# Altium footprint library MEGAphone.PcbLib: 64 footprints (part 1 of 4)
Each footprint in its own frame and in the unit in brackets; x right, y up, seen from the top. Pads: shape width x height; smd on the part's side, far side on the other; paste and mask are expansions set on the pad; w line width, h text height; cw(c..) or ccw(c..) is an arc to the next point about the centre after c.
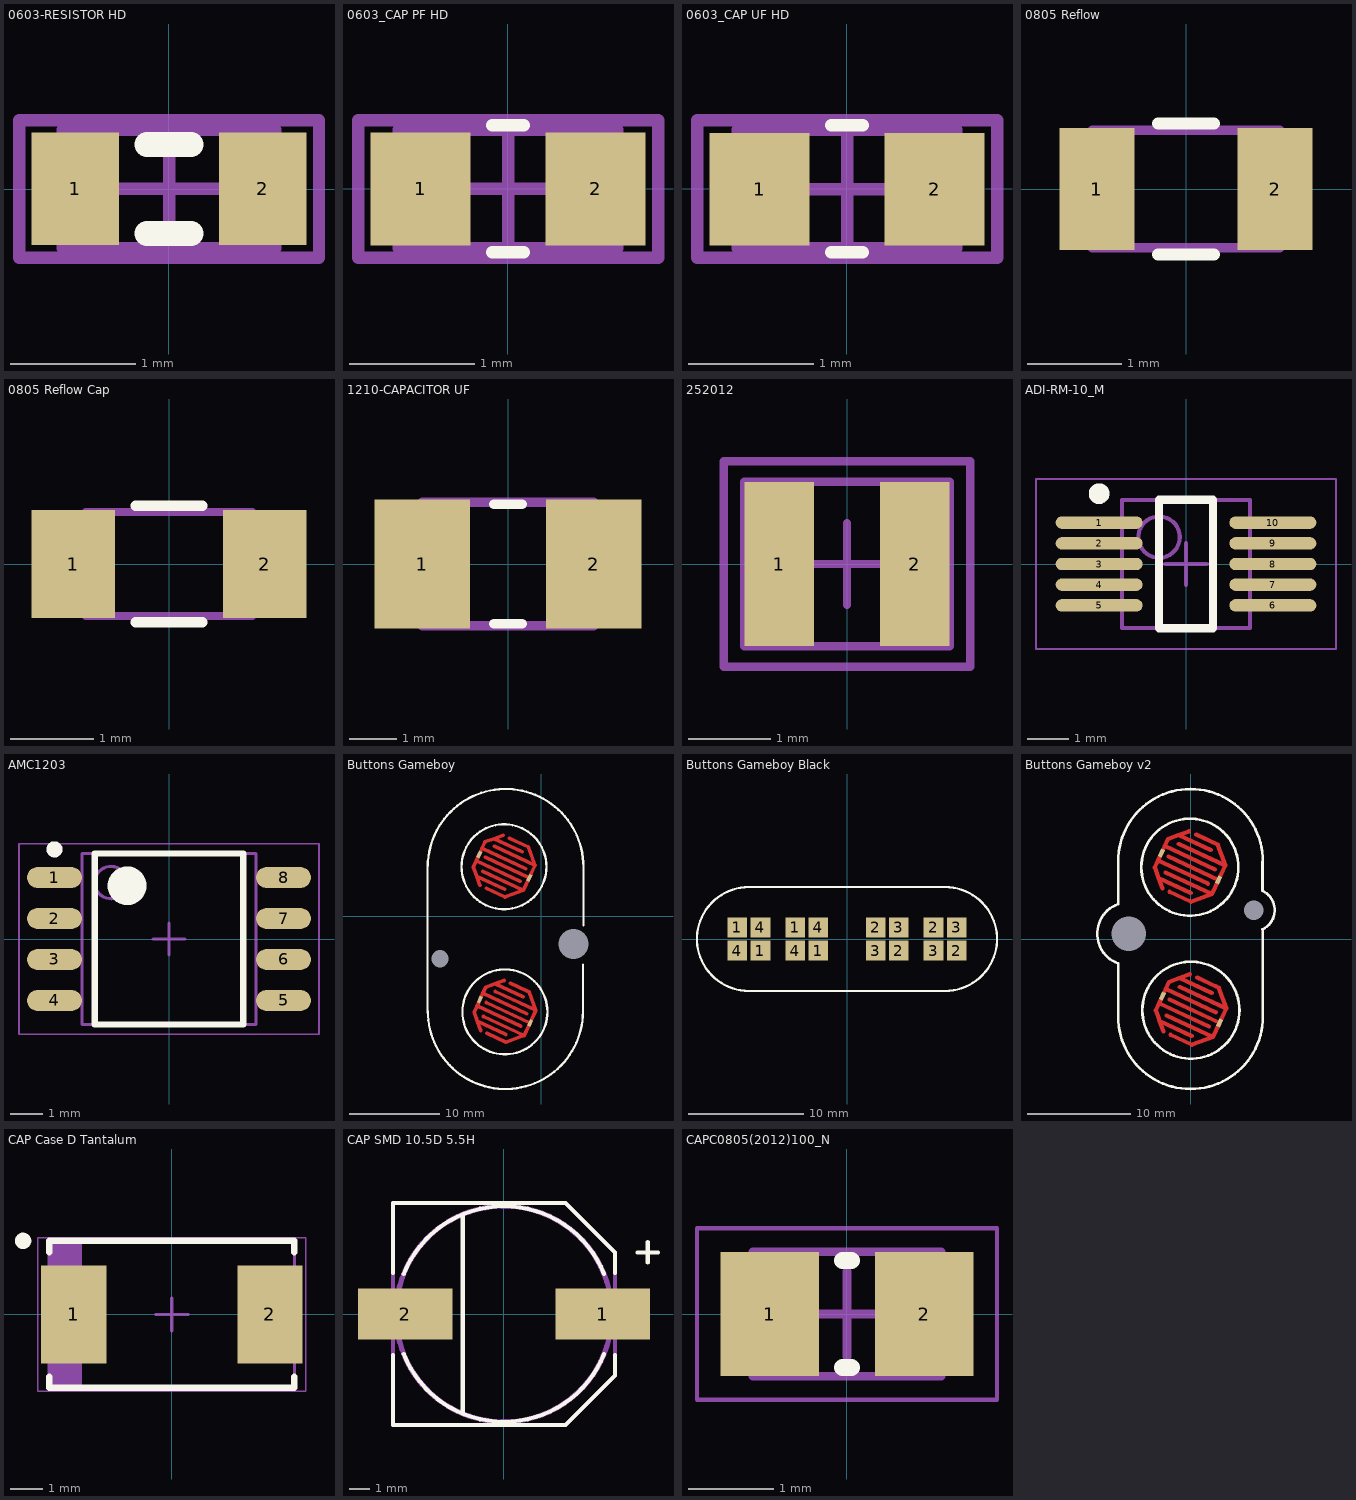
[diagram p0: the footprints below, top view; thin cyan lines are the x and y axes]

## 8SOP [mm] "Footprint for AMC1203PSA"
height 2

## 0603-RESISTOR HD [mm] "Chip Resistor, Body 1.6x0.8mm, IPC High Density"
height 0.6
pads (2):
  rect 0.7x0.9 smd: 1(-0.75,0) 2(0.75,0)
Top Overlay:
  lines w0.2: -0.178,-0.356 0.178,-0.356 ; -0.178,0.356 0.178,0.356
Mechanical 13:
  lines w0.1: -0.85,-0.475 -0.85,0.475 0.85,0.475 0.85,-0.475 -0.85,-0.475
Mechanical 15:
  lines w0.1: -0.475,0 0.475,0 ; 0,-0.475 0,0.475 ; -1.2,-0.55 -1.2,0.55 1.2,0.55 1.2,-0.55 -1.2,-0.55
3D body: height 0.6, standoff 0, extent -0.85,-0.475 0.85,0.475

## 0603_CAP PF HD [mm] "Chip Capacitor, Body 1.6x0.8mm, IPC High Density"
height 0.35
pads (2):
  rect 0.8x0.9 smd: 1(-0.7,0) 2(0.7,0)
Top Overlay:
  lines w0.1: -0.127,-0.508 0.127,-0.508 ; -0.127,0.508 0.127,0.508
Mechanical 13:
  lines w0.1: -0.875,-0.475 0.875,-0.475 0.875,0.475 -0.875,0.475 -0.875,-0.475
Mechanical 15:
  lines w0.1: -0.475,0 0.475,0 ; 0,-0.475 0,0.475 ; -1.2,-0.55 1.2,-0.55 1.2,0.55 -1.2,0.55 -1.2,-0.55
3D body: height 0.35, standoff 0, extent -0.875,-0.475 0.875,0.475

## 0603_CAP UF HD [mm] "Chip Capacitor, Body 1.6x0.8mm, IPC High Density"
height 0.8
pads (2):
  rect 0.8x0.9 smd: 1(-0.7,0) 2(0.7,0)
Top Overlay:
  lines w0.1: -0.127,-0.508 0.127,-0.508 ; -0.127,0.508 0.127,0.508
Mechanical 13:
  lines w0.1: -0.875,-0.475 -0.875,0.475 0.875,0.475 0.875,-0.475 -0.875,-0.475
Mechanical 15:
  lines w0.1: -0.475,0 0.475,0 ; 0,-0.475 0,0.475 ; -1.2,-0.55 -1.2,0.55 1.2,0.55 1.2,-0.55 -1.2,-0.55
3D body: height 0.8, standoff 0, extent -0.875,-0.475 0.875,0.475

## 0805 Reflow [mm]
pads (2):
  rect 0.8x1.3 smd: 1(-0.95,0) 2(0.95,0)
Top Overlay:
  lines w0.127: -0.3,-0.7 0.3,-0.7 ; -0.3,0.7 0.3,0.7
Mechanical 13:
  lines w0.1: -1,-0.625 1,-0.625 1,0.625 -1,0.625 -1,-0.625
3D body: height 0.5, standoff 0, extent -1,-0.625 1,0.625

## 0805 Reflow Cap [mm]
pads (2):
  rect 1x1.3 smd: 1(-1.15,0) 2(1.15,0)
Top Overlay:
  lines w0.127: -0.4,-0.7 0.4,-0.7 ; -0.4,0.7 0.4,0.7
Mechanical 13:
  lines w0.1: -1,-0.625 1,-0.625 1,0.625 -1,0.625 -1,-0.625
3D body: height 1, standoff 0, extent -1,-0.625 1,0.625

## 1210-CAPACITOR UF [mm] "Body 3.2 x 2.5 mm (LxW typ)"
height 2.5
pads (2):
  rect 2x2.7 smd: 1(-1.8,0) 2(1.8,0)
Top Overlay:
  lines w0.2: -0.3,-1.25 0.3,-1.25 ; -0.3,1.25 0.3,1.25
Mechanical 13:
  lines w0.2: -1.8,-1.3 0,-1.3 1.8,-1.3 1.8,0 1.8,1.3 0,1.3 -1.8,1.3 -1.8,0 -1.8,-1.3
3D body: height 2.5, standoff 0, extent -1.799,-1.299 1.799,1.299

## 252012 [mm] "SMD Power Inductor, 2-Leads, Body 2.5x2.0mm"
height 1.2
pads (2):
  rect 0.85x2 smd: 1(-0.825,0) 2(0.825,0)
Mechanical 13:
  lines w0.1: -1.25,-1 1.25,-1 1.25,1 -1.25,1 -1.25,-1
Mechanical 15:
  lines w0.1: -0.5,0 0.5,0 ; 0,-0.5 0,0.5 ; -1.5,-1.25 1.5,-1.25 1.5,1.25 -1.5,1.25 -1.5,-1.25
3D body "LQS_252012.stp": height 1.18, standoff -0.02, extent -1.25,-1 1.25,1

## ADI-RM-10_M [mm] "SOP, 10-Leads, Body 3x3mm, Pitch 0.5mm, IPC Low Density"
height 1.1
pads (10):
  oval 2.1x0.3 smd: 1(-2.1,1) 2(-2.1,0.5) 3(-2.1,0) 4(-2.1,-0.5) 5(-2.1,-1) 6(2.1,-1) 7(2.1,-0.5) 8(2.1,0) 9(2.1,0.5) 10(2.1,1)
Top Overlay:
  circle w0.25: c-2.1,1.7 r0.125
  lines w0.2: -0.65,-1.55 -0.65,1.55 0.65,1.55 0.65,-1.55 -0.65,-1.55
Mechanical 13:
  circle w0.1: c-0.65,0.65 r0.5
  lines w0.1: -1.55,-1.55 -1.55,1.55 1.55,1.55 1.55,-1.55 -1.55,-1.55
Mechanical 15:
  lines w0.05: -3.625,-2.05 -3.625,2.05 3.625,2.05 3.625,-2.05 -3.625,-2.05
  lines w0.1: -0.5,0 0.5,0 ; 0,-0.5 0,0.5
3D body: height 1.1, standoff 0.05, extent -1.55,-1.55 1.55,1.55

## AMC1203 [mm] "SOP, 8-Leads, Body 5.27x5.30mm, Pitch 1.27mm, IPC Medium Density"
height 2
pads (8):
  oval 1.7x0.65 smd: 1(-3.55,1.905) 2(-3.55,0.635) 3(-3.55,-0.635) 4(-3.55,-1.905) 5(3.55,-1.905) 6(3.55,-0.635) 7(3.55,0.635) 8(3.55,1.905)
Top Overlay:
  circle w0.25: c-3.55,2.78 r0.125
  circle w0.6: c-1.3,1.65 r0.3
  lines w0.2: -2.3,-2.65 -2.3,2.65 2.3,2.65 2.3,-2.65 -2.3,-2.65
Mechanical 13:
  circle w0.1: c-1.8,1.75 r0.5
  lines w0.1: -2.7,-2.65 -2.7,2.65 2.7,2.65 2.7,-2.65 -2.7,-2.65
Mechanical 15:
  lines w0.05: -4.65,-2.95 -4.65,2.95 4.65,2.95 4.65,-2.95 -4.65,-2.95
  lines w0.1: -0.5,0 0.5,0 ; 0,-0.5 0,0.5
3D body "AMC1203.step": height 2, standoff 0, extent -3.95,-2.65 3.95,2.65

## Buttons Gameboy [mil]
pads (6):
  rect 32x16 smd rot 65 paste-118.11: 1(-270.57,268.2) 2(-266.76,-362.51) 3(-49.25,-463.94) 4(-53.06,166.77)
  round 0 hole 129.92: 27(140,-120)
  round 0 hole 74.8: ""(-440,-185)
Top Layer:
  lines w16: -266.91,134.08 -281.42,173.95 ; -263.1,-496.62 -277.61,-456.75 ; -255.15,194.8 -78.42,112.39 ; -251.34,-435.9 -74.61,-518.31 ; -243.39,255.52 -53.06,166.77 ; -239.72,121.4 -158.15,83.37 -150.8,86.04 -78.42,112.39 ; -239.57,-375.18 -49.25,-463.94 ; -235.91,-509.3 -154.34,-547.33 -74.61,-518.31 ; -204.43,303.56 -27.7,221.15 ; -200.62,-327.15 -23.89,-409.56 ; -165.48,351.6 -205.35,337.09 ; -161.67,-279.11 -201.54,-293.62 ; -159.07,116.9 -281.42,173.95 ; -155.26,-513.81 -277.61,-456.75 ; -138.29,338.92 -56.72,300.88 -27.7,221.15 ; -134.48,-291.78 -64.13,-324.59 -52.91,-329.82 -23.89,-409.56 ; -92.93,152.26 -283.25,241.01 ; -89.12,-478.44 -279.44,-389.7 ; -83,280.03 -205.35,337.09 ; -79.19,-350.67 -201.54,-293.62 ; -67.57,206.64 -257.9,295.39 ; -63.76,-424.07 -254.09,-335.32 ; -283.25,241.01 -270.57,268.2 ; -283.25,241.01 -295.93,213.82 -281.42,173.95 ; -279.44,-389.7 -266.76,-362.51 -254.09,-335.32 ; -279.44,-389.7 -292.12,-416.88 -282.19,-444.17 -277.61,-456.75 ; -270.57,268.2 -257.9,295.39 ; -270.57,268.2 -270.57,268.2 ; -270.57,268.2 -270.57,268.2 ; -257.9,295.39 -245.22,322.57 -205.35,337.09 ; -254.09,-335.32 -241.41,-308.13 -201.54,-293.62 ; -78.42,112.39 -53.06,166.77 ; -74.61,-518.31 -49.25,-463.94 ; -74.61,-518.31 -49.25,-463.94 ; -53.06,166.77 -27.7,221.15 ; -49.25,-463.94 -23.89,-409.56
Top Overlay:
  circle w10: c-162.4,214.87 r184.69
  circle w10: c-158.46,-415.89 r184.69
  lines w10: -495,-412.41 -495,240 ; -493.66,219.76 cw(c-155.48,214.53) 182.73,214.57 182.73,-40.35 ; -493.12,-412.41 ccw(c-156.2,-414.06) 180.72,-414.06 ; 180.72,-424.07 180.72,-211.61
Top Solder:
  circle w177.17: c-162.4,214.87 r78.74
  circle w177.17: c-158.46,-415.89 r78.74

## Buttons Gameboy Black [mm] "DMG-SEL"
pads (16):
  rect 1.7x1.7 smd paste-3: 1(-9.5,1) 1(-7.5,-1) 1(-4.5,1) 1(-2.5,-1) 2(2.5,1) 2(4.5,-1) 2(7.5,1) 2(9.5,-1) 3(2.5,-1) 3(4.5,1) 3(7.5,-1) 3(9.5,1) 4(-9.5,-1) 4(-7.5,1) 4(-4.5,-1) 4(-2.5,1)
Top Overlay:
  lines w0.2: -8.5,-4.5 cw(c-8.5,0) -8.5,4.5 8.5,4.5 cw(c8.5,0) 8.5,-4.5 -8.5,-4.5
Top Solder:
  region: -1.5,2 -5.5,2 -5.5,-2 -1.5,-2
  rectangle: -10.5,-2 -6.5,2
  region: 10.5,2 6.5,2 6.5,-2 10.5,-2
  rectangle: 1.5,-2 5.5,2

## Buttons Gameboy v2 [mil]
pads (6):
  rect 32x16 smd rot 65 paste-118.11: 1(-110.57,326.56) 2(-106.76,-217.51) 3(110.75,-318.94) 4(106.94,225.13)
  round 0 hole 129.92: 27(-235,20)
  round 0 hole 74.8: ""(240,110)
Top Layer:
  lines w16: -106.91,192.45 -121.42,232.32 ; -103.1,-351.62 -117.61,-311.75 ; -95.15,253.17 81.58,170.75 ; -91.34,-290.9 85.39,-373.31 ; -83.39,313.88 106.94,225.13 ; -79.72,179.77 1.85,141.73 9.2,144.41 81.58,170.75 ; -79.57,-230.18 110.75,-318.94 ; -75.91,-364.3 5.66,-402.33 85.39,-373.31 ; -44.43,361.92 132.3,279.51 ; -40.62,-182.15 136.11,-264.56 ; -5.48,409.96 -45.35,395.45 ; -1.67,-134.11 -41.54,-148.62 ; 0.93,175.26 -121.42,232.32 ; 4.74,-368.81 -117.61,-311.75 ; 21.71,397.28 103.28,359.25 132.3,279.51 ; 25.52,-146.78 95.87,-179.59 107.09,-184.82 136.11,-264.56 ; 67.07,210.62 -123.25,299.37 ; 70.88,-333.44 -119.44,-244.7 ; 77,338.4 -45.35,395.45 ; 80.81,-205.67 -41.54,-148.62 ; 92.43,265 -97.9,353.75 ; 96.24,-279.07 -94.08,-190.32 ; -123.25,299.37 -110.57,326.56 ; -123.25,299.37 -135.93,272.18 -121.42,232.32 ; -119.44,-244.7 -106.76,-217.51 -94.08,-190.32 ; -119.44,-244.7 -132.12,-271.88 -122.19,-299.17 -117.61,-311.75 ; -110.57,326.56 -97.9,353.75 ; -110.57,326.56 -110.57,326.56 ; -110.57,326.56 -110.57,326.56 ; -97.9,353.75 -85.22,380.94 -45.35,395.45 ; -94.08,-190.32 -81.41,-163.13 -41.54,-148.62 ; 81.58,170.75 106.94,225.13 ; 85.39,-373.31 110.75,-318.94 ; 85.39,-373.31 110.75,-318.94 ; 106.94,225.13 132.3,279.51 ; 110.75,-318.94 136.11,-264.56
Top Overlay:
  circle w10: c-2.4,273.23 r184.69
  circle w10: c1.54,-270.89 r184.69
  lines w10: -275.59,-295.28 ccw(c0,-295.28) 275.59,-295.28 275.59,35.44 ; -275.59,-293.92 -275.59,-94.5 ; -275.59,295.28 cw(c0,295.28) 275.59,295.28 ; -275,135 -275,300 ; -274.42,-93.34 cw(c-235,20) -274.42,133.34 ; 274.09,36.94 ccw(c240,110) 274.09,183.06 274.09,293.81
Top Solder:
  circle w177.17: c-2.4,273.23 r78.74
  circle w177.17: c1.54,-270.89 r78.74

## CAP Case D Tantalum [mm] "Molded Capacitor, 2-Leads, Body 7.50x4.5mm"
height 3.1
pads (2):
  rect 2x3 smd: 1(-3,0) 2(3,0)
Top Overlay:
  circle w0.25: c-4.55,2.25 r0.125
  lines w0.2: -3.75,-1.9 -3.75,-2.25 3.75,-2.25 3.75,-1.9 ; -3.75,1.9 -3.75,2.25 3.75,2.25 3.75,1.9
Mechanical 13:
  region: -2.741,2.25 -3.75,2.25 -3.75,-2.25 -2.741,-2.25
  lines w0.1: -3.75,-2.25 -3.75,2.25 3.75,2.25 3.75,-2.25 -3.75,-2.25
Mechanical 15:
  lines w0.05: -4.1,-2.35 -4.1,2.35 4.1,2.35 4.1,-2.35 -4.1,-2.35
  lines w0.1: -0.5,0 0.5,0 ; 0,-0.5 0,0.5
3D body "CAPMP7344X31L.step": height 3.1, standoff 0, extent -3.97,-2.25 3.97,2.25

## CAP SMD 10.5D 5.5H [mm]
height 5.5
pads (2):
  rect 4.6x2.5 smd: 1(4.8,0) 2(-4.8,0)
Top Overlay:
  lines w0.2: -5.4,-2 -5.4,-5.4 3,-5.4 5.4,-3 5.4,-2 ; -5.4,2 -5.4,5.4 3,5.4 5.4,3 5.4,2 ; -4.875,-1.95 ccw(c0,0) 4.875,-1.95 ; -4.875,1.95 cw(c0,0) 4.875,1.95 ; -2,-4.8 -2,0 -2,4.8 ; 6.5,3 7.5,3 ; 7,2.5 7,3.5
Mechanical 13:
  circle w0.254: c0,0 r5.25
  lines w0.2: -5.4,-5.4 -5.4,0 -5.4,5.4 3,5.4 5.4,3 5.4,0 5.4,-3 3,-5.4 -5.4,-5.4
3D body: height 5.5, standoff 0, extent -5.249,-5.249 5.249,5.249
3D body: height 1, standoff 0, extent -5.401,-5.401 5.401,5.401

## CAPC0805(2012)100_N [mm] "Chip Capacitor, Body 2.0x1.2mm, Height 1.0mm, IPC Medium Density"
height 1
pads (2):
  rect 1.15x1.45 smd: 1(-0.9,0) 2(0.9,0)
Top Overlay:
  lines w0.2: -0.05,-0.625 0.05,-0.625 ; -0.05,0.625 0.05,0.625
Mechanical 13:
  lines w0.1: -1.1,-0.725 1.1,-0.725 1.1,0.725 -1.1,0.725 -1.1,-0.725
Mechanical 15:
  lines w0.05: -1.75,-1 1.75,-1 1.75,1 -1.75,1 -1.75,-1
  lines w0.1: -0.5,0 0.5,0 ; 0,-0.5 0,0.5
3D body: height 1, standoff 0, extent 0.6,-0.725 1.1,0.725
3D body: height 1, standoff 0, extent -1.1,-0.725 -0.6,0.725
3D body: height 1, standoff 0, extent -0.6,-0.725 0.6,0.725